# Altium footprint library ThanhNT.PcbLib: 579 footprints (part 12 of 37)
Each footprint in its own frame and in the unit in brackets; x right, y up, seen from the top. Pads: shape width x height; smd on the part's side, far side on the other; paste and mask are expansions set on the pad; w line width, h text height; cw(c..) or ccw(c..) is an arc to the next point about the centre after c.
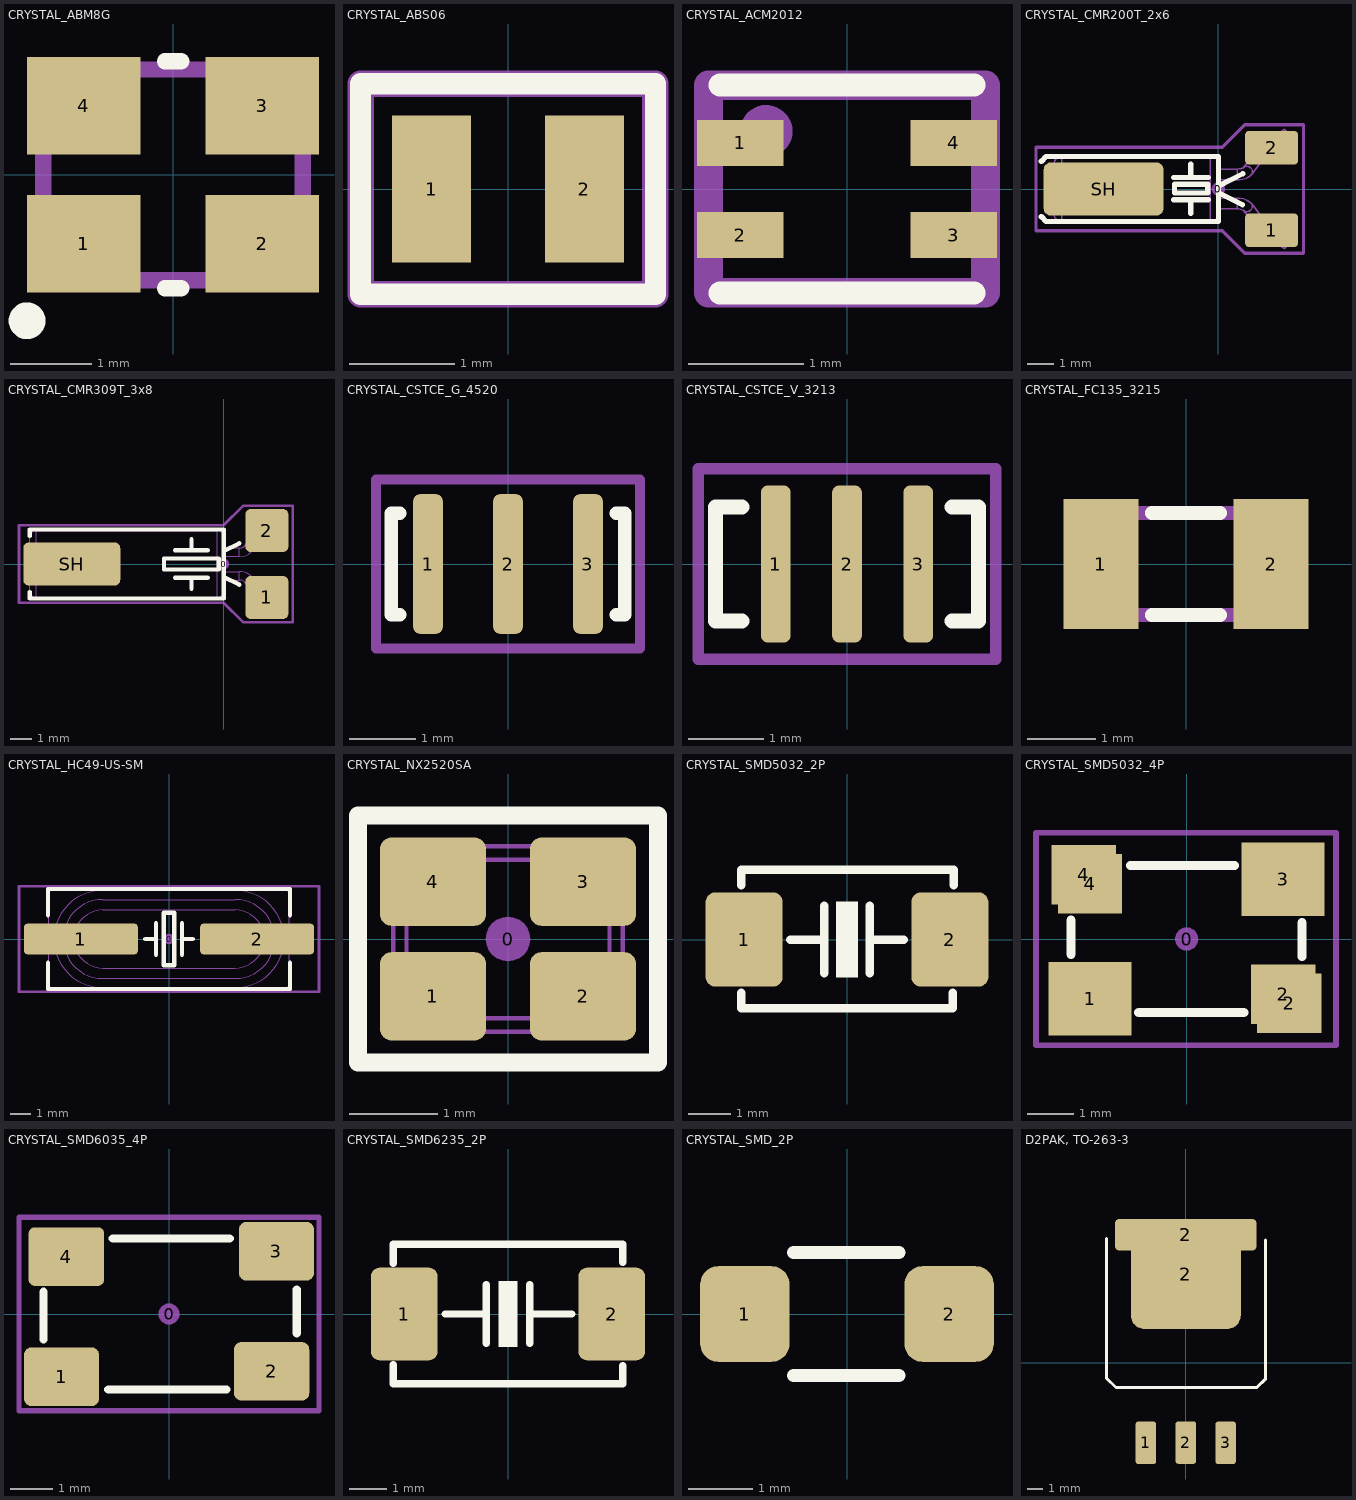
[diagram p11: the footprints below, top view; thin cyan lines are the x and y axes]

## CRYSTAL_ABM8G [mm]
pads (4):
  rect 1.4x1.2 smd mask+0.1: 1(-1.1,-0.85) 2(1.1,-0.85) 3(1.1,0.85) 4(-1.1,0.85)
Top Overlay:
  circle w0.254: c-1.8,-1.8 r0.1
  lines w0.2: -0.1,-1.4 0.1,-1.4 ; -0.1,1.4 0.1,1.4
Mechanical 16:
  circle w0.254: c-1.1,-0.9 r0.1
  lines w0.2: -1.6,-1.3 1.6,-1.3 1.6,1.3 -1.6,1.3 -1.6,-1.3
3D body: height 1.02, standoff 0.98, extent -1.15,-0.9 1.15,0.9
3D body "ABM8G.step": height 1.01, standoff 0, extent -1.6,-1.25 1.6,1.25

## CRYSTAL_ABS06 [mm]
pads (2):
  rect 0.75x1.4 smd: 1(-0.725,0) 2(0.725,0)
Top Overlay:
  lines w0.2: -1.4,-1 -1.4,0 -1.4,1 1.4,1 1.4,-1 -1.4,-1
Mechanical 16:
  lines w0.254: -1.4,-1 1.4,-1 1.4,1 -1.4,1 -1.4,-1
3D body "ABS06.STEP": height 0.6, standoff 0, extent -1,-0.62 1,0.6
3D body: height 0.61, standoff 0.5, extent -0.825,-0.36 0.825,0.34

## CRYSTAL_ACM2012 [mm]
pads (4):
  rect 0.75x0.4 smd mask+0.076: 1(-0.925,0.4) 2(-0.925,-0.4) 3(0.925,-0.4) 4(0.925,0.4)
Top Overlay:
  lines w0.2: -1.1,-0.9 1.1,-0.9 ; -1.1,0.9 1.1,0.9
Mechanical 16:
  circle w0.254: c-0.7,0.5 r0.1
  lines w0.254: -1.2,-0.9 1.2,-0.9 1.2,0.9 -1.2,0.9 -1.2,-0.9
3D body: height 1.3, standoff 0, extent -1.2,-0.7 1.2,0.7

## CRYSTAL_CMR200T_2x6 [mm] "SMD Crystal CMR200T package (2x6mm)"
height 3.1
pads (4):
  round 0.508 on Mech15: 0(0,0)
  rrect25% 2x1.27 smd: 1(2,-1.55) 2(2,1.55)
  rrect25% 4.5x2 smd: SH(-4.318,0)
Top Overlay:
  lines w0.2: -6.655,-1.041 -6.477,-1.219 0,-1.219 0,-0.14 0.904,-0.592 ; -6.655,1.041 -6.477,1.219 ; -1.676,-0.406 -0.381,-0.406 ; -1.676,0.432 -0.381,0.432 ; -1.041,-0.914 -1.041,-0.406 ; -1.041,0.432 -1.041,0.94 ; 0,-0.6 0,0.6 ; 0.914,0.571 0,0.114 0,1.219 -6.477,1.219 ; -6.477,1.219 -6.477,1.219 ; -1.651,-0.152 -1.651,0.178 -0.406,0.178 -0.406,-0.152 -1.651,-0.152
Mechanical 13:
  lines w0.05: 0,-0.75 0.71,-0.75 ; 0,-0.35 0.71,-0.35 ; 0,0.35 0.71,0.35 ; 0,0.75 0.71,0.75 ; 0.931,-0.79 0.937,-0.798 0.965,-0.823 0.999,-0.84 1.037,-0.85 1.077,-0.851 1.118,-0.843 1.158,-0.828 1.195,-0.805 1.226,-0.776 1.252,-0.741 1.27,-0.704 1.279,-0.664 1.28,-0.625 1.271,-0.588 1.255,-0.555 1.25,-0.548 ; 0.931,0.79 0.937,0.798 0.965,0.823 0.999,0.84 1.037,0.85 1.077,0.851 1.118,0.843 1.158,0.828 1.195,0.805 1.226,0.776 1.252,0.741 1.27,0.704 1.279,0.664 1.28,0.625 1.271,0.588 1.255,0.555 1.25,0.548 ; -5.893,-1.219 cw(c-5.893,-0.919) -6.193,-0.919 -6.193,0.92 cw(c-5.893,0.92) -5.893,1.22 ; -5.893,-1.219 -0.3,-1.219 ; -5.893,-1.219 -5.893,1.22 ; -5.893,1.22 -0.3,1.22 ; -0.3,-1.219 ccw(c-0.3,-0.919) 0,-0.919 0,0.92 ccw(c-0.3,0.92) -0.3,1.22 ; -0.3,-1.219 -0.3,1.22 ; 0.71,-0.75 cw(c0.741,-1.171) 0.936,-0.796 1.229,-1.183 ; 0.71,-0.75 0.71,-0.35 ; 0.71,-0.35 cw(c0.757,-1.055) 1.25,-0.548 ; 0.71,0.35 ccw(c0.775,1.007) 1.25,0.548 ; 0.71,0.35 0.71,0.75 ; 0.71,0.75 0.73,0.75 0.773,0.753 0.814,0.758 0.851,0.765 0.881,0.773 0.906,0.781 0.923,0.789 0.933,0.794 0.937,0.797 ; 0.937,0.797 0.937,0.797 ; 0.937,0.797 1.229,1.183 ; 1.229,-1.183 ccw(c2.616,-0.029) 1.491,-1.439 ; 1.229,-1.183 1.236,-1.191 1.263,-1.216 1.297,-1.234 1.335,-1.243 1.376,-1.244 1.417,-1.237 1.456,-1.221 1.493,-1.198 1.525,-1.169 1.55,-1.135 1.568,-1.097 1.577,-1.058 1.578,-1.019 1.569,-0.982 1.553,-0.948 1.548,-0.942 ; 1.229,1.183 cw(c2.589,0.057) 1.491,1.439 ; 1.229,1.183 1.236,1.191 1.263,1.216 1.297,1.234 1.335,1.243 1.376,1.244 1.417,1.237 1.456,1.221 1.493,1.198 1.525,1.169 1.55,1.135 1.568,1.097 1.577,1.058 1.578,1.019 1.569,0.982 1.553,0.948 1.548,0.942 ; 1.25,-0.548 1.548,-0.942 ; 1.25,0.548 1.548,0.942 ; 1.491,-1.439 ccw(c0.753,-0.568) 1.746,-1.132 ; 1.491,-1.439 2.472,-2.254 ccw(c1.735,-1.382) 2.728,-1.946 1.746,-1.132 ; 1.491,1.439 cw(c0.753,0.568) 1.746,1.132 ; 1.491,1.439 2.472,2.254 cw(c1.735,1.382) 2.728,1.946 1.746,1.132 ; 1.548,-0.942 ccw(c2.638,-0.003) 1.746,-1.132 ; 1.548,0.942 cw(c2.604,0.039) 1.746,1.132
Mechanical 15:
  lines w0.127: -6.858,-1.575 -6.858,1.575 0.152,1.575 0.991,2.413 3.2,2.413 3.2,-2.413 0.991,-2.413 0.152,-1.575 -6.858,-1.575
3D body "User Library-CMR200TB.STEP": height 2, standoff 0, extent -6.218,-1.553 2.759,1.502

## CRYSTAL_CMR309T_3x8 [mm] "SMD Crystal CMR309T package (3x8mm)"
height 3.1
pads (4):
  round 0.508 on Mech15: 0(0,0)
  rrect25% 2x2 smd: 1(2,-1.55) 2(2,1.55)
  rrect25% 4.5x2 smd: SH(-7.05,0)
Top Overlay:
  lines w0.2: -9,-1.3 -9,-1.6 0,-1.6 0,-0.6 ; -9,1.3 -9,1.6 0,1.6 0,0.6 ; -2.262,-0.635 -0.738,-0.635 ; -2.262,0.635 -0.738,0.635 ; -1.5,-1.143 -1.5,-0.635 ; -1.5,0.635 -1.5,1.143 ; 0.72,-0.96 0,-0.6 ; 0.72,0.96 0,0.6 ; 0,-0.6 0,0.6 ; -2.77,-0.254 -0.23,-0.254 -0.23,0.254 -2.77,0.254 -2.77,-0.254
Mechanical 13:
  lines w0.05: 0,-0.75 0.71,-0.75 ; 0,-0.35 0.71,-0.35 ; 0,0.35 0.71,0.35 ; 0,0.75 0.71,0.75 ; 0.931,-0.79 0.937,-0.798 0.965,-0.823 0.999,-0.84 1.037,-0.85 1.077,-0.851 1.118,-0.843 1.158,-0.828 1.195,-0.805 1.226,-0.776 1.252,-0.741 1.27,-0.704 1.279,-0.664 1.28,-0.625 1.271,-0.588 1.255,-0.555 1.25,-0.548 ; 0.931,0.79 0.937,0.798 0.965,0.823 0.999,0.84 1.037,0.85 1.077,0.851 1.118,0.843 1.158,0.828 1.195,0.805 1.226,0.776 1.252,0.741 1.27,0.704 1.279,0.664 1.28,0.625 1.271,0.588 1.255,0.555 1.25,0.548 ; -8.7,-1.55 cw(c-8.7,-1.25) -9,-1.25 -9,1.25 cw(c-8.7,1.25) -8.7,1.55 ; -8.7,-1.55 -8.7,1.55 ; -8.7,-1.55 -0.3,-1.55 ; -8.7,1.55 -0.3,1.55 ; -0.3,-1.55 ccw(c-0.3,-1.25) 0,-1.25 0,1.25 ccw(c-0.3,1.25) -0.3,1.55 ; -0.3,-1.55 -0.3,1.55 ; 0.71,-0.75 cw(c0.741,-1.171) 0.936,-0.796 1.229,-1.183 ; 0.71,-0.75 0.71,-0.35 ; 0.71,-0.35 cw(c0.757,-1.055) 1.25,-0.548 ; 0.71,0.35 ccw(c0.775,1.007) 1.25,0.548 ; 0.71,0.35 0.71,0.75 ; 0.71,0.75 0.73,0.75 0.773,0.753 0.814,0.758 0.851,0.765 0.881,0.773 0.906,0.781 0.923,0.789 0.933,0.794 0.937,0.797 ; 0.937,0.797 1.229,1.183 ; 0.937,0.797 0.937,0.797 ; 1.229,-1.183 ccw(c2.616,-0.029) 1.491,-1.439 ; 1.229,-1.183 1.236,-1.191 1.263,-1.216 1.297,-1.234 1.335,-1.243 1.376,-1.244 1.417,-1.237 1.456,-1.221 1.493,-1.198 1.525,-1.169 1.55,-1.135 1.568,-1.097 1.577,-1.058 1.578,-1.019 1.569,-0.982 1.553,-0.948 1.548,-0.942 ; 1.229,1.183 cw(c2.589,0.057) 1.491,1.439 ; 1.229,1.183 1.236,1.191 1.263,1.216 1.297,1.234 1.335,1.243 1.376,1.244 1.417,1.237 1.456,1.221 1.493,1.198 1.525,1.169 1.55,1.135 1.568,1.097 1.577,1.058 1.578,1.019 1.569,0.982 1.553,0.948 1.548,0.942 ; 1.25,-0.548 1.548,-0.942 ; 1.25,0.548 1.548,0.942 ; 1.491,-1.439 ccw(c0.753,-0.568) 1.746,-1.132 ; 1.491,-1.439 2.472,-2.254 ccw(c1.735,-1.382) 2.728,-1.946 1.746,-1.132 ; 1.491,1.439 cw(c0.753,0.568) 1.746,1.132 ; 1.491,1.439 2.472,2.254 cw(c1.735,1.382) 2.728,1.946 1.746,1.132 ; 1.548,-0.942 ccw(c2.638,-0.003) 1.746,-1.132 ; 1.548,0.942 cw(c2.604,0.039) 1.746,1.132
Mechanical 15:
  lines w0.127: -9.5,-1.8 0,-1.8 0.9,-2.7 3.2,-2.7 3.2,2.7 0.9,2.7 0,1.8 -9.5,1.8 -9.5,-1.8
3D body "Crystal CMR309T.STEP": height 3.07, standoff -0.01, extent -9,-2.254 2.728,2.254

## CRYSTAL_CSTCE_G_4520 [mm]
height 1
pads (3):
  rrect50% 0.45x2.1 smd: 1(-1.2,0) 2(0,0) 3(1.2,0)
Top Overlay:
  lines w0.2: -1.626,-0.762 -1.753,-0.762 -1.753,0.762 -1.626,0.762 ; 1.626,-0.762 1.753,-0.762 1.753,0.762 1.626,0.762
Mechanical 16:
  lines w0.152: -1.981,-1.27 1.981,-1.27 1.981,1.27 -1.981,1.27 -1.981,-1.27
3D body "SW3dPS-CSTCE.STEP": height 0.7, standoff 0, extent -1.6,-0.65 1.6,0.65

## CRYSTAL_CSTCE_V_3213 [mm]
height 1
pads (3):
  rrect50% 0.4x2.1 smd: 1(-0.95,0) 2(0,0) 3(0.95,0)
Top Overlay:
  lines w0.2: -1.397,-0.762 -1.753,-0.762 -1.753,0.762 -1.397,0.762 ; 1.397,-0.762 1.753,-0.762 1.753,0.762 1.397,0.762
Mechanical 16:
  lines w0.152: -1.981,-1.27 -1.981,1.27 1.981,1.27 1.981,-1.27 -1.981,-1.27
3D body "SW3dPS-CSTCE_V-1.STEP": height 1.02, standoff -0.09, extent -1.6,-0.635 1.6,0.665

## CRYSTAL_FC135_3215 [mm] "3.20mm x 1.50mm"
pads (2):
  rect 1.1x1.9 smd: 1(-1.25,0) 2(1.25,0)
Top Overlay:
  lines w0.203: -0.5,-0.75 0.5,-0.75 ; -0.5,0.75 0.5,0.75
Mechanical 16:
  lines w0.203: -1.6,-0.75 -1.6,0.75 1.6,0.75 1.6,-0.75 -1.6,-0.75
3D body "User Library-ABS07.STEP": height 0.92, standoff 0.01, extent -1.61,-0.76 1.61,0.76

## CRYSTAL_HC49-US-SM [mm] "SMD Crystal HC49/US-SM package"
height 4.3
pads (3):
  round 0.508 on Mech15: 0(0,0)
  rrect25% 5.5x1.5 smd: 1(-4.25,0) 2(4.25,0)
Top Overlay:
  lines w0.2: -5.842,-1.143 -5.842,-2.413 5.842,-2.413 5.842,-1.143 ; -5.842,1.143 -5.842,2.413 5.842,2.413 5.842,1.143 ; -1.143,0 -0.635,0 ; -0.635,-0.762 -0.635,0.762 ; 0.635,-0.762 0.635,0.762 ; 0.635,0 1.143,0 ; -0.254,-1.27 0.254,-1.27 0.254,1.27 -0.254,1.27 -0.254,-1.27
Mechanical 13:
  lines w0.05: -5.8,-0.45 -6.4,-0.45 -6.4,0.45 -5.8,0.45 ; 5.8,-0.45 6.4,-0.45 6.4,0.45 5.8,0.45 ; -5.8,-2.165 ccw(c-5.55,-2.165) -5.55,-2.415 5.55,-2.415 ccw(c5.55,-2.165) 5.8,-2.165 5.8,2.165 ccw(c5.55,2.165) 5.55,2.415 -5.55,2.415 ccw(c-5.55,2.165) -5.8,2.165 -5.8,-2.165 ; -3.2,-2.35 cw(c-3.2,0) -3.2,2.35 3.2,2.35 cw(c3.2,0) 3.2,-2.35 -3.2,-2.35 ; -3.2,-1.9 cw(c-3.2,0) -3.2,1.9 3.2,1.9 cw(c3.2,0) 3.2,-1.9 -3.2,-1.9 ; -3.2,-1.4 cw(c-3.2,0) -3.2,1.4 3.2,1.4 cw(c3.2,0) 3.2,-1.4 -3.2,-1.4
Mechanical 15:
  lines w0.127: -7.239,-2.54 7.239,-2.54 7.239,2.54 -7.239,2.54 -7.239,-2.54
3D body "Crystal HC49_US-SM.STEP": height 4.29, standoff -0.01, extent -6.4,-2.415 6.4,2.415

## CRYSTAL_NX2520SA [mm] "SMD Crystal 4-lead leadless package"
height 0.55
pads (5):
  round 0.508 on Mech15: 0(0,0)
  rrect25% 1.2x1 smd mask+0.075: 1(-0.85,-0.65) 2(0.85,-0.65) 3(0.85,0.65) 4(-0.85,0.65)
Top Overlay:
  lines w0.2: -1.7,-1.4 -1.7,1.4 1.7,1.4 1.7,-1.4 -1.7,-1.4
Mechanical 13:
  lines w0.05: -1.3,-0.87 cw(c-1.3,-1.05) -1.12,-1.05 1.12,-1.05 cw(c1.3,-1.05) 1.3,-0.87 1.3,0.87 cw(c1.3,1.05) 1.12,1.05 -1.12,1.05 cw(c-1.3,1.05) -1.3,0.87 -1.3,-0.87 ; -1.15,-0.75 ccw(c-1,-0.75) -1,-0.9 1,-0.9 ccw(c1,-0.75) 1.15,-0.75 1.15,0.75 ccw(c1,0.75) 1,0.9 -1,0.9 ccw(c-1,0.75) -1.15,0.75 -1.15,-0.75
Mechanical 15:
  lines w0.127: -1.7,-1.4 1.7,-1.4 1.7,1.4 -1.7,1.4 -1.7,-1.4
3D body "Crystal NDK NX2520SA series.STEP": height 0.55, standoff 0, extent -1.3,-1.05 1.3,1.05

## CRYSTAL_SMD5032_2P [mm]
pads (2):
  rrect25% 1.8x2.2 smd: 1(-2.4,0) 2(2.4,0)
Top Overlay:
  rectangle: -0.254,-0.889 0.254,0.889
  lines w0.2: -2.464,-1.245 -2.464,-1.6 2.464,-1.6 2.464,-1.245 ; -2.464,1.27 -2.464,1.626 2.489,1.626 2.489,1.27 ; -1.321,0 -0.533,0 ; -0.533,-0.787 -0.533,0.787 ; 0.533,-0.787 0.533,0.787 ; 0.533,0 1.321,0
3D body "User Library-445-CRYTAL-SMD.STEP": height 1.36, standoff 0.01, extent -2.5,-1.6 2.5,1.6

## CRYSTAL_SMD5032_4P [mm]
pads (7):
  round 0.508 on Mech15: 0(0,0)
  rect 1.8x1.6 smd: 1(-2.1,-1.3) 3(2.1,1.3)
  rect 1.4x1.3 smd: 2(2.1,-1.2) 2(2.235,-1.397) 4(-2.235,1.397) 4(-2.1,1.2)
Top Overlay:
  lines w0.2: -2.515,-0.33 -2.515,0.406 ; -1.219,1.6 1.041,1.6 ; -1.041,-1.6 1.245,-1.6 ; 2.515,-0.381 2.515,0.356
Mechanical 15:
  lines w0.127: -3.277,-2.311 -3.277,2.311 3.251,2.311 3.251,-2.311 -3.277,-2.311
3D body "User Library-Crystal.STEP": height 0.96, standoff 0.01, extent -2.5,-1.6 2.5,1.6

## CRYSTAL_SMD6035_4P [mm]
pads (5):
  round 0.508 on Mech15: 0(0,0)
  rrect25% 1.8x1.4 smd mask+0.075: 1(-2.565,-1.499) 2(2.45,-1.37) 3(2.565,1.499)
  rrect20% 1.8x1.4 smd mask+0.075: 4(-2.45,1.37)
Top Overlay:
  lines w0.2: -2.997,-0.61 -2.997,0.533 ; -1.448,-1.803 1.372,-1.803 ; -1.346,1.803 1.448,1.803 ; 3.048,-0.457 3.048,0.584
Mechanical 15:
  lines w0.127: -3.581,-2.311 3.581,-2.311 3.581,2.311 -3.581,2.311 -3.581,-2.311
3D body "User Library-ABMM2.STEP": height 1.21, standoff 0, extent -3,-1.8 3,1.8

## CRYSTAL_SMD6235_2P [mm]
pads (2):
  rrect25% 1.8x2.5 smd: 1(-2.8,0) 2(2.8,0)
Top Overlay:
  rectangle: -0.254,-0.889 0.254,0.889
  lines w0.2: -3.099,-1.372 -3.099,-1.88 3.099,-1.88 3.099,-1.397 ; -3.099,1.372 -3.099,1.88 3.099,1.88 3.099,1.397 ; -1.702,0 -0.584,0 ; -0.584,-0.787 -0.584,0.787 ; 0.584,-0.787 0.584,0.787 ; 0.584,0 1.727,0
3D body "User Library-Xtal-ABM7.STEP": height 1.41, standoff 0.01, extent -3.099,-1.825 3.101,1.875

## CRYSTAL_SMD_2P [mm]
pads (2):
  rrect40% 1.4x1.5 smd: 1(-1.6,0) 2(1.6,0)
Top Overlay:
  lines w0.2: -0.838,-0.965 0.813,-0.965 ; -0.838,0.965 0.813,0.965

## D2PAK, TO-263-3 [mm]
pads (5):
  rrect25% 1.3x2.7 smd: 1(-2.54,-5.093) 2(0,-5.08) 3(2.54,-5.093)
  rrect25% 7x7 smd: 2(0,5.639)
  rrect25% 9x2 smd: 2(0,8.153)
Top Overlay:
  lines w0.2: -5.055,7.899 -5.055,-0.965 -4.445,-1.575 4.521,-1.575 5.08,-1.016 5.08,7.823
3D body "User Library-D²PAK TO-263-3.STEP": height 4.87, standoff 0, extent -5.08,-5.82 5.08,8.41